# Altium footprint library myPCBLib (AirPC's conflicted copy 2014-06-14).PcbLib: 57 footprints (part 2 of 4)
Each footprint in its own frame and in the unit in brackets; x right, y up, seen from the top. Pads: shape width x height; smd on the part's side, far side on the other; paste and mask are expansions set on the pad; w line width, h text height; cw(c..) or ccw(c..) is an arc to the next point about the centre after c.
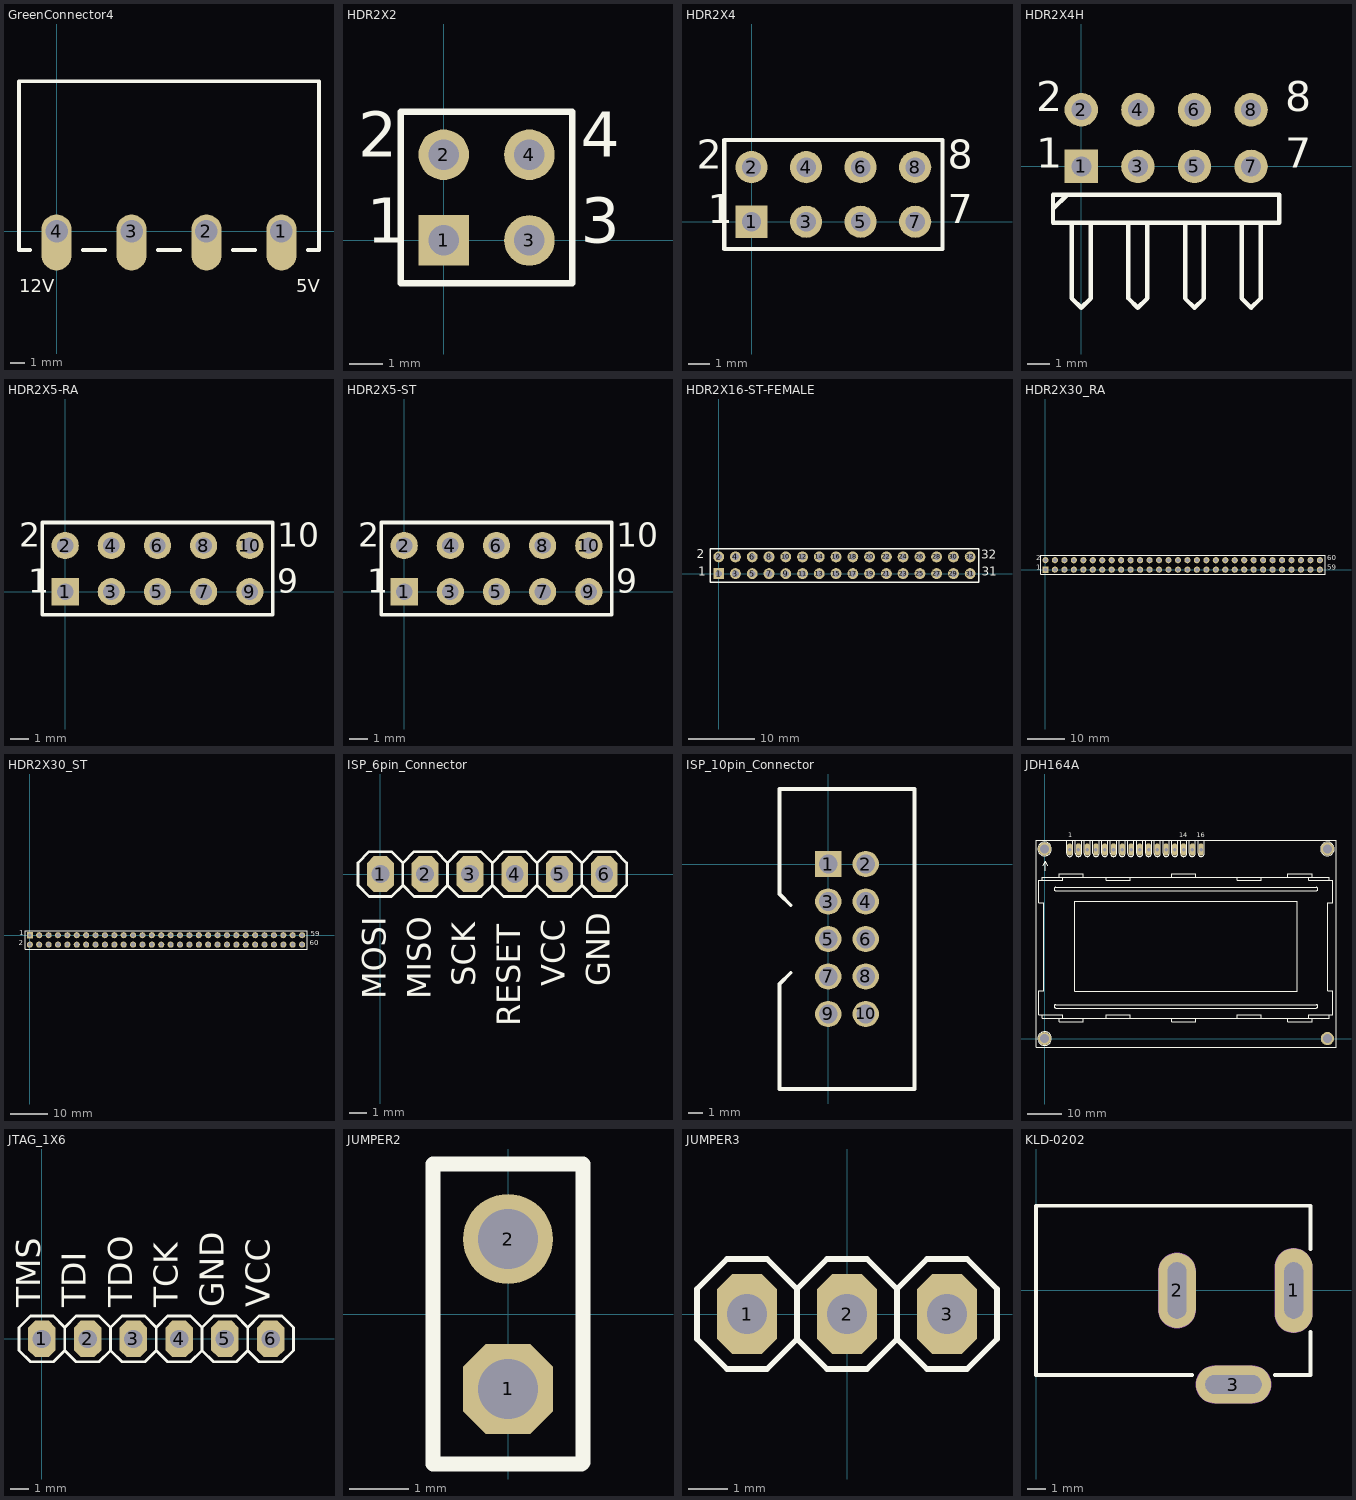
[diagram p1: the footprints below, top view; thin cyan lines are the x and y axes]

## GreenConnector4 [mil]
pads (4):
  oval 80x150 hole 60 copper offset 0,-30: 1(600,0) 2(400,0) 3(200,0) 4(0,0)
Top Overlay:
  lines w10: -70,-50 -100,-50 -100,400 700,400 700,-50 670,-50 ; 70,-50 130,-50 ; 270,-50 330,-50 ; 470,-50 530,-50
  text "12V" at -100,-175 h60
  text "5V" at 640,-175 h60

## HDR2X2 [mm]
pads (4):
  rect 1.5x1.5 hole 0.9: 1(0,0)
  round 1.5 hole 0.9: 2(0,2.54) 3(2.54,0) 4(2.54,2.54)
Top Overlay:
  lines w0.2: -1.27,-1.27 3.81,-1.27 3.81,3.81 -1.27,3.81 -1.27,-1.27
  text "3" at 4.064,-0.508 h2.29
  text "4" at 4.064,2.032 h2.29
  text "2" at -2.54,2.032 h2.29
  text "1" at -2.286,-0.508 h2.29

## HDR2X4 [mm]
pads (8):
  rect 1.5x1.5 hole 0.9: 1(0,0)
  round 1.5 hole 0.9: 2(0,2.54) 3(2.54,0) 4(2.54,2.54) 5(5.08,0) 6(5.08,2.54) 7(7.62,0) 8(7.62,2.54)
Top Overlay:
  lines w0.2: -1.27,-1.27 8.89,-1.27 8.89,3.81 -1.27,3.81 -1.27,-1.27
  text "2" at -2.54,2.032 h2.29
  text "1" at -2.032,-0.508 h2.29
  text "7" at 9.144,-0.508 h2.29
  text "8" at 9.144,2.032 h2.29
3D body: height 8.5, standoff -3, extent -1.27,-1.397 8.89,3.683

## HDR2X4H [mm]
pads (8):
  rect 1.5x1.5 hole 0.9: 1(0,0)
  round 1.5 hole 0.9: 2(0,2.54) 3(2.54,0) 4(2.54,2.54) 5(5.08,0) 6(5.08,2.54) 7(7.62,0) 8(7.62,2.54)
Top Overlay:
  lines w0.2: -1.27,-1.905 -0.635,-1.27 ; -0.423,-2.54 -0.423,-5.927 0,-6.35 0.423,-5.927 0.423,-2.54 ; 2.117,-2.54 2.117,-5.927 2.54,-6.35 2.963,-5.927 2.963,-2.54 ; 4.657,-2.54 4.657,-5.927 5.08,-6.35 5.503,-5.927 5.503,-2.54 ; 7.197,-2.54 7.197,-5.927 7.62,-6.35 8.043,-5.927 8.043,-2.54 ; -1.27,-2.54 -1.27,-1.27 8.89,-1.27 8.89,-2.54 -1.27,-2.54
  text "8" at 9.144,2.032 h2.29
  text "7" at 9.144,-0.508 h2.29
  text "1" at -2.032,-0.508 h2.29
  text "2" at -2.032,2.032 h2.29
3D body: height 5.04, standoff -2.96, extent -1.27,-9.996 8.89,2.884

## HDR2X5-RA [mm]
pads (10):
  rect 1.5x1.5 hole 0.9: 1(0,0)
  round 1.5 hole 0.9: 2(0,2.54) 3(2.54,0) 4(2.54,2.54) 5(5.08,0) 6(5.08,2.54) 7(7.62,0) 8(7.62,2.54) 9(10.16,0) 10(10.16,2.54)
Top Overlay:
  lines w0.2: -1.27,-1.27 11.43,-1.27 11.43,3.81 -1.27,3.81 -1.27,-1.27
  text "10" at 11.684,2.032 h2.29
  text "9" at 11.684,-0.508 h2.29
  text "1" at -2.032,-0.508 h2.29
  text "2" at -2.54,2.032 h2.29
3D body: height 5.04, standoff -2.96, extent -1.25,-10.055 11.45,2.825

## HDR2X5-ST [mm]
pads (10):
  rect 1.5x1.5 hole 0.9: 1(0,0)
  round 1.5 hole 0.9: 2(0,2.54) 3(2.54,0) 4(2.54,2.54) 5(5.08,0) 6(5.08,2.54) 7(7.62,0) 8(7.62,2.54) 9(10.16,0) 10(10.16,2.54)
Top Overlay:
  lines w0.2: -1.27,-1.27 11.43,-1.27 11.43,3.81 -1.27,3.81 -1.27,-1.27
  text "10" at 11.684,2.032 h2.29
  text "9" at 11.684,-0.508 h2.29
  text "1" at -2.032,-0.508 h2.29
  text "2" at -2.54,2.032 h2.29
3D body: height 8.5, standoff -3, extent -1.275,-1.175 11.425,3.905

## HDR2X16-ST-FEMALE [mil]
pads (32):
  rect 65x65 hole 40: 1(0,0)
  round 65 hole 40: 2(0,100) 3(100,0) 4(100,100) 5(200,0) 6(200,100) 7(300,0) 8(300,100) 9(400,0) 10(400,100) 11(500,0) 12(500,100) 13(600,0) 14(600,100) 15(700,0) 16(700,100) 17(800,0) 18(800,100) 19(900,0) 20(900,100) 21(1000,0) 22(1000,100) 23(1100,0) 24(1100,100) 25(1200,0) 26(1200,100) 27(1300,0) 28(1300,100) 29(1400,0) 30(1400,100) 31(1500,0) 32(1500,100)
Top Overlay:
  lines w7.87: -50,-50 -50,150 1550,150 1550,-50 -50,-50
  text "32" at 1566.26,70 h90
  text "31" at 1570,-30 h90
  text "1" at -121.42,-29.53 h90
  text "2" at -129.53,75.16 h90
3D body: height 334.65, standoff -125.98, extent -55,-50 1554.84,146.85

## HDR2X30_RA [mil]
pads (60):
  rect 65x65 hole 40: 1(0,0)
  round 65 hole 40: 2(0,100) 3(100,0) 4(100,100) 5(200,0) 6(200,100) 7(300,0) 8(300,100) 9(400,0) 10(400,100) 11(500,0) 12(500,100) 13(600,0) 14(600,100) 15(700,0) 16(700,100) 17(800,0) 18(800,100) 19(900,0) 20(900,100) 21(1000,0) 22(1000,100) 23(1100,0) 24(1100,100) 25(1200,0) 26(1200,100) 27(1300,0) 28(1300,100) 29(1400,0) 30(1400,100) 31(1500,0) 32(1500,100) 33(1600,0) 34(1600,100) 35(1700,0) 36(1700,100) 37(1800,0) 38(1800,100) 39(1900,0) 40(1900,100) 41(2000,0) 42(2000,100) 43(2100,0) 44(2100,100) 45(2200,0) 46(2200,100) 47(2300,0) 48(2300,100) 49(2400,0) 50(2400,100) 51(2500,0) 52(2500,100) 53(2600,0) 54(2600,100) 55(2700,0) 56(2700,100) 57(2800,0) 58(2800,100) 59(2900,0) 60(2900,100)
Top Overlay:
  lines w7.87: -50,-50 2955.12,-50 2955.12,150 -50,150 -50,-50
  text "60" at 2980,80 h90
  text "59" at 2980,-20 h90
  text "1" at -100,-20 h90
  text "2" at -100,80 h90
3D body: height 198.43, standoff -116.54, extent -48.23,-394.88 2951.77,112.21

## HDR2X30_ST [mil]
pads (60):
  rect 65x65 hole 40: 1(0,0)
  round 65 hole 40: 2(0,-100) 3(100,0) 4(100,-100) 5(200,0) 6(200,-100) 7(300,0) 8(300,-100) 9(400,0) 10(400,-100) 11(500,0) 12(500,-100) 13(600,0) 14(600,-100) 15(700,0) 16(700,-100) 17(800,0) 18(800,-100) 19(900,0) 20(900,-100) 21(1000,0) 22(1000,-100) 23(1100,0) 24(1100,-100) 25(1200,0) 26(1200,-100) 27(1300,0) 28(1300,-100) 29(1400,0) 30(1400,-100) 31(1500,0) 32(1500,-100) 33(1600,0) 34(1600,-100) 35(1700,0) 36(1700,-100) 37(1800,0) 38(1800,-100) 39(1900,0) 40(1900,-100) 41(2000,0) 42(2000,-100) 43(2100,0) 44(2100,-100) 45(2200,0) 46(2200,-100) 47(2300,0) 48(2300,-100) 49(2400,0) 50(2400,-100) 51(2500,0) 52(2500,-100) 53(2600,0) 54(2600,-100) 55(2700,0) 56(2700,-100) 57(2800,0) 58(2800,-100) 59(2900,0) 60(2900,-100)
Top Overlay:
  lines w7.87: -50,-150 -50,50 2955.12,50 2955.12,-150 -50,-150
  text "2" at -115.16,-129.92 h90
  text "1" at -110.24,-20.67 h90
  text "60" at 2982.28,-126.97 h90
  text "59" at 2990.16,-31.5 h90
3D body: height 334.65, standoff -118.11, extent -49.21,-151.57 2950.79,48.43

## ISP_6pin_Connector [mil]
pads (6):
  oct 60x80 hole 40: 1(0,0) 2(100,0) 3(200,0) 4(300,0) 5(400,0) 6(500,0)
Top Overlay:
  lines w6: 50,-25 75,-50 125,-50 150,-25 ; 50,-25 25,-50 -25,-50 -50,-25 -50,25 -25,50 25,50 50,25 ; 50,-25 50,25 ; 50,25 75,50 125,50 150,25 ; 150,-25 150,25 ; 150,-25 175,-50 225,-50 250,-25 ; 150,25 175,50 225,50 250,25 ; 250,-25 275,-50 325,-50 350,-25 ; 250,-25 250,25 ; 250,25 275,50 325,50 350,25 ; 350,-25 375,-50 425,-50 450,-25 ; 350,-25 350,25 ; 350,25 375,50 425,50 450,25 ; 450,-25 475,-50 525,-50 550,-25 550,25 525,50 475,50 450,25 ; 450,-25 450,25
  text "MOSI" at 30,-280 h90
  text "MISO" at 130,-280 h90
  text "SCK" at 230,-250 h90
  text "RESET" at 330,-340 h90
  text "VCC" at 430,-250 h90
  text "GND" at 530,-250 h90
3D body: height 99.02, standoff -118.11, extent -50,-10 550,388.82

## ISP_10pin_Connector [mil]
pads (10):
  rect 70x70 hole 50: 1(0,0)
  round 70 hole 50: 2(100,0) 3(0,-100) 4(100,-100) 5(0,-200) 6(100,-200) 7(0,-300) 8(100,-300) 9(0,-400) 10(100,-400)
Top Overlay:
  lines w10: -100,-290 -130,-320 -130,-600 230,-600 230,200 -130,200 -130,-80 -100,-110
3D body: height 346.46, standoff -118.11, extent -133.93,-597.64 236.15,197.64

## JDH164A [mil]
pads (20):
  oct 60x140 hole 40: 1(286.42,2159.45) 2(386.42,2159.45) 3(486.42,2159.45) 4(586.42,2159.45) 5(686.42,2159.45) 6(786.42,2159.45) 7(886.42,2159.45) 8(986.42,2159.45) 9(1086.42,2159.45) 10(1186.42,2159.45) 11(1286.42,2159.45) 12(1386.42,2159.45) 13(1486.42,2159.45) 14(1586.42,2159.45) 15(1686.42,2159.45) 16(1786.42,2159.45)
  round 149.61 hole 100: P$1(0,0.98)
  round 151.18 hole 100: P$2(0,2166.34) P$3(3228.35,2166.34) P$4(3228.35,0.98)
Top Overlay:
  drawing of 155 lines, arcs and shapes, not listed
  text "1" at 271.92,2284.45 h90
  text "16" at 1736.92,2284.45 h90
  text "14" at 1536.92,2284.45 h90
3D body: height 366.14, standoff -122.05, extent -98.43,-98.43 3326.77,2263.78
3D body: height 435.04, standoff -53.15, extent -98.43,-98.43 3326.77,2263.78

## JTAG_1X6 [mil]
pads (6):
  oct 60x80 hole 40: 1(0,0) 2(100,0) 3(200,0) 4(300,0) 5(400,0) 6(500,0)
Top Overlay:
  rectangle: 389.95,-10 409.95,10
  rectangle: 289.95,-10 309.95,10
  rectangle: 189.95,-10 209.95,10
  rectangle: 89.95,-10 109.95,10
  rectangle: -10.05,-10 9.95,10
  rectangle: 489.95,-10 509.95,10
  lines w6: 50,-25 50,25 ; 50,-25 25,-50 -25,-50 -50,-25 -50,25 -25,50 25,50 50,25 ; 50,-25 75,-50 125,-50 150,-25 ; 50,25 75,50 125,50 150,25 ; 150,-25 175,-50 225,-50 250,-25 ; 150,-25 150,25 ; 150,25 175,50 225,50 250,25 ; 250,-25 250,25 ; 250,-25 275,-50 325,-50 350,-25 ; 250,25 275,50 325,50 350,25 ; 350,-25 350,25 ; 350,-25 375,-50 425,-50 450,-25 ; 350,25 375,50 425,50 450,25 ; 450,-25 450,25 ; 450,-25 475,-50 525,-50 550,-25 550,25 525,50 475,50 450,25
  text "VCC" at 515.75,68.9 h90
  text "GND" at 415.35,68.84 h90
  text "TCK" at 314.96,68.84 h90
  text "TDO" at 214.57,68.84 h90
  text "TDI" at 113.53,68.84 h90
  text "TMS" at 13.78,68.84 h90

## JUMPER2 [mil]
pads (2):
  oct 60x60 hole 40: 1(0,-50)
  round 60 hole 40: 2(0,50)
Top Overlay:
  lines w10: -50,-100 49,-100 50,-99 50,0 50,100 -50,100 -50,-100
3D body: height 404.72, standoff 150, extent -46.06,-98.03 50,98.03
3D body: height 98.11, standoff -390.08, extent -53.28,-95 45,105

## JUMPER3 [mil]
height 393.7
pads (3):
  oct 60x80 hole 40: 1(-100,0) 2(0,0) 3(100,0)
Top Overlay:
  lines w6: -50,-25 -20,-55 20,-55 50,-25 ; -50,-25 -80,-55 -120,-55 -150,-25 -150,25 -120,55 -80,55 -50,25 ; -50,-25 -50,25 ; -50,25 -20,55 20,55 50,25 ; 50,-25 80,-55 120,-55 150,-25 150,25 120,55 80,55 50,25 ; 50,-25 50,25
3D body: height 404.72, standoff 150, extent -46.06,-50 150,46.06
3D body: height 370.08, standoff -118.11, extent -145,-48.28 155,50

## KLD-0202 [mm]
pads (3):
  oval 2x4.5 hole 1 slot 3 at 90 deg: 1(13.7,0)
  oval 2x4 hole 1 slot 3 at 90 deg: 2(7.5,0)
  oval 4x2 hole 1 slot 3 at 0 deg: 3(10.5,-5)
Top Overlay:
  lines w0.2: 8.3,-4.5 0,-4.5 0,4.5 14.6,4.5 14.6,2.2 ; 12.7,-4.5 14.6,-4.5 14.6,-2.2
Mechanical 1:
  lines w1: 7.5,-1 7.5,1 ; 9.5,-5 11.5,-5 ; 13.7,-1.25 13.7,1.25
Mechanical 2:
  lines w2.016: 7.5,-1 7.5,1 ; 9.5,-5 11.5,-5 ; 13.7,-1.25 13.7,1.25